# Altium footprint library con-samtec.PCBLIB: 805 footprints (part 43 of 55) (continued)
## TSW-134-02-S-T [mm] (continued)
  rectangle: -21.94,-2.89 -21.24,-2.19
  rectangle: -21.94,-0.35 -21.24,0.35
  rectangle: -21.94,2.19 -21.24,2.89
  rectangle: -19.4,-2.89 -18.7,-2.19
  rectangle: -19.4,-0.35 -18.7,0.35
  rectangle: -19.4,2.19 -18.7,2.89
  rectangle: -16.86,-2.89 -16.16,-2.19
  rectangle: -16.86,-0.35 -16.16,0.35
  rectangle: -16.86,2.19 -16.16,2.89
  rectangle: -14.32,-2.89 -13.62,-2.19
  rectangle: -14.32,-0.35 -13.62,0.35
  rectangle: -14.32,2.19 -13.62,2.89
  rectangle: -11.78,-2.89 -11.08,-2.19
  rectangle: -11.78,-0.35 -11.08,0.35
  rectangle: -11.78,2.19 -11.08,2.89
  rectangle: -9.24,-2.89 -8.54,-2.19
  rectangle: -9.24,-0.35 -8.54,0.35
  rectangle: -9.24,2.19 -8.54,2.89
  rectangle: -6.7,-2.89 -6,-2.19
  rectangle: -6.7,-0.35 -6,0.35
  rectangle: -6.7,2.19 -6,2.89
  rectangle: -4.16,-2.89 -3.46,-2.19
  rectangle: -4.16,-0.35 -3.46,0.35
  rectangle: -4.16,2.19 -3.46,2.89
  rectangle: -1.62,-2.89 -0.92,-2.19
  rectangle: -1.62,-0.35 -0.92,0.35
  rectangle: -1.62,2.19 -0.92,2.89
  rectangle: 0.92,-2.89 1.62,-2.19
  rectangle: 0.92,-0.35 1.62,0.35
  rectangle: 0.92,2.19 1.62,2.89
  rectangle: 3.46,-2.89 4.16,-2.19
  rectangle: 3.46,-0.35 4.16,0.35
  rectangle: 3.46,2.19 4.16,2.89
  rectangle: 6,-2.89 6.7,-2.19
  rectangle: 6,-0.35 6.7,0.35
  rectangle: 6,2.19 6.7,2.89
  rectangle: 8.54,-2.89 9.24,-2.19
  rectangle: 8.54,-0.35 9.24,0.35
  rectangle: 8.54,2.19 9.24,2.89
  rectangle: 11.08,-2.89 11.78,-2.19
  rectangle: 11.08,-0.35 11.78,0.35
  rectangle: 11.08,2.19 11.78,2.89
  rectangle: 13.62,-2.89 14.32,-2.19
  rectangle: 13.62,-0.35 14.32,0.35
  rectangle: 13.62,2.19 14.32,2.89
  rectangle: 16.16,-2.89 16.86,-2.19
  rectangle: 16.16,-0.35 16.86,0.35
  rectangle: 16.16,2.19 16.86,2.89
  rectangle: 18.7,-2.89 19.4,-2.19
  rectangle: 18.7,-0.35 19.4,0.35
  rectangle: 18.7,2.19 19.4,2.89
  rectangle: 21.24,-2.89 21.94,-2.19
  rectangle: 21.24,-0.35 21.94,0.35
  rectangle: 21.24,2.19 21.94,2.89
  rectangle: 23.78,-2.89 24.48,-2.19
  rectangle: 23.78,-0.35 24.48,0.35
  rectangle: 23.78,2.19 24.48,2.89
  rectangle: 26.32,-2.89 27.02,-2.19
  rectangle: 26.32,-0.35 27.02,0.35
  rectangle: 26.32,2.19 27.02,2.89
  rectangle: 28.86,-2.89 29.56,-2.19
  rectangle: 28.86,-0.35 29.56,0.35
  rectangle: 28.86,2.19 29.56,2.89
  rectangle: 31.4,-2.89 32.1,-2.19
  rectangle: 31.4,-0.35 32.1,0.35
  rectangle: 31.4,2.19 32.1,2.89
  rectangle: 33.94,-2.89 34.64,-2.19
  rectangle: 33.94,-0.35 34.64,0.35
  rectangle: 33.94,2.19 34.64,2.89
  rectangle: 36.48,-2.89 37.18,-2.19
  rectangle: 36.48,-0.35 37.18,0.35
  rectangle: 36.48,2.19 37.18,2.89
  rectangle: 39.02,-2.89 39.72,-2.19
  rectangle: 39.02,-0.35 39.72,0.35
  rectangle: 39.02,2.19 39.72,2.89
  rectangle: 41.56,-2.89 42.26,-2.19
  rectangle: 41.56,-0.35 42.26,0.35
  rectangle: 41.56,2.19 42.26,2.89

## TSW-134-02-S-T-RA [mil]
pads (102):
  oct 59.06x59.06 hole 39.37: 1(1650,60) 2(1650,160) 3(1650,260) 4(1550,60) 5(1550,160) 6(1550,260) 7(1450,60) 8(1450,160) 9(1450,260) 10(1350,60) 11(1350,160) 12(1350,260) 13(1250,60) 14(1250,160) 15(1250,260) 16(1150,60) 17(1150,160) 18(1150,260) 19(1050,60) 20(1050,160) 21(1050,260) 22(950,60) 23(950,160) 24(950,260) 25(850,60) 26(850,160) 27(850,260) 28(750,60) 29(750,160) 30(750,260) 31(650,60) 32(650,160) 33(650,260) 34(550,60) 35(550,160) 36(550,260) 37(450,60) 38(450,160) 39(450,260) 40(350,60) 41(350,160) 42(350,260) 43(250,60) 44(250,160) 45(250,260) 46(150,60) 47(150,160) 48(150,260) 49(50,60) 50(50,160) 51(50,260) 52(-50,60) 53(-50,160) 54(-50,260) 55(-150,60) 56(-150,160) 57(-150,260) 58(-250,60) 59(-250,160) 60(-250,260) 61(-350,60) 62(-350,160) 63(-350,260) 64(-450,60) 65(-450,160) 66(-450,260) 67(-550,60) 68(-550,160) 69(-550,260) 70(-650,60) 71(-650,160) 72(-650,260) 73(-750,60) 74(-750,160) 75(-750,260) 76(-850,60) 77(-850,160) 78(-850,260) 79(-950,60) 80(-950,160) 81(-950,260) 82(-1050,60) 83(-1050,160) 84(-1050,260) 85(-1150,60) 86(-1150,160) 87(-1150,260) 88(-1250,60) 89(-1250,160) 90(-1250,260) 91(-1350,60) 92(-1350,160) 93(-1350,260) 94(-1450,60) 95(-1450,160) 96(-1450,260) 97(-1550,60) 98(-1550,160) 99(-1550,260) 100(-1650,60) 101(-1650,160) 102(-1650,260)
Top Overlay:
  rectangle: -1660,-310.63 -1640,-80.32
  rectangle: -1560,-310.63 -1540,-80.32
  rectangle: -1460,-310.63 -1440,-80.32
  rectangle: -1360,-310.63 -1340,-80.32
  rectangle: -1260,-310.63 -1240,-80.32
  rectangle: -1160,-310.63 -1140,-80.32
  rectangle: -1060,-310.63 -1040,-80.32
  rectangle: -960,-310.63 -940,-80.32
  rectangle: -860,-310.63 -840,-80.32
  rectangle: -760,-310.63 -740,-80.32
  rectangle: -660,-310.63 -640,-80.32
  rectangle: -560,-310.63 -540,-80.32
  rectangle: -460,-310.63 -440,-80.32
  rectangle: -360,-310.63 -340,-80.32
  rectangle: -260,-310.63 -240,-80.32
  rectangle: -160,-310.63 -140,-80.32
  rectangle: -60,-310.63 -40,-80.32
  rectangle: 40,-310.63 60,-80.32
  rectangle: 140,-310.63 160,-80.32
  rectangle: 240,-310.63 260,-80.32
  rectangle: 340,-310.63 360,-80.32
  rectangle: 440,-310.63 460,-80.32
  rectangle: 540,-310.63 560,-80.32
  rectangle: 640,-310.63 660,-80.32
  rectangle: 740,-310.63 760,-80.32
  rectangle: 840,-310.63 860,-80.32
  rectangle: 940,-310.63 960,-80.32
  rectangle: 1040,-310.63 1060,-80.32
  rectangle: 1140,-310.63 1160,-80.32
  rectangle: 1240,-310.63 1260,-80.32
  rectangle: 1340,-310.63 1360,-80.32
  rectangle: 1440,-310.63 1460,-80.32
  rectangle: 1540,-310.63 1560,-80.32
  rectangle: 1640,-310.63 1660,-80.32
  lines w8: -1705.08,-80.55 1705.08,-80.55 1705.08,-4.17 -1705.08,-4.17 -1705.08,-80.55
  text "1" at 1701.57,41.34 h36.81
  text "3" at 1702.17,236.81 h36.81
Mechanical 16:
  rectangle: -1660,0 -1640,270
  rectangle: -1560,0 -1540,270
  rectangle: -1460,0 -1440,270
  rectangle: -1360,0 -1340,270
  rectangle: -1260,0 -1240,270
  rectangle: -1160,0 -1140,270
  rectangle: -1060,0 -1040,270
  rectangle: -960,0 -940,270
  rectangle: -860,0 -840,270
  rectangle: -760,0 -740,270
  rectangle: -660,0 -640,270
  rectangle: -560,0 -540,270
  rectangle: -460,0 -440,270
  rectangle: -360,0 -340,270
  rectangle: -260,0 -240,270
  rectangle: -160,0 -140,270
  rectangle: -60,0 -40,270
  rectangle: 40,0 60,270
  rectangle: 140,0 160,270
  rectangle: 240,0 260,270
  rectangle: 340,0 360,270
  rectangle: 440,0 460,270
  rectangle: 540,0 560,270
  rectangle: 640,0 660,270
  rectangle: 740,0 760,270
  rectangle: 840,0 860,270
  rectangle: 940,0 960,270
  rectangle: 1040,0 1060,270
  rectangle: 1140,0 1160,270
  rectangle: 1240,0 1260,270
  rectangle: 1340,0 1360,270
  rectangle: 1440,0 1460,270
  rectangle: 1540,0 1560,270
  rectangle: 1640,0 1660,270

## TSW-135-02-S-D [mm]
pads (70):
  oct 1.5x1.5 hole 1: 1(43.18,-1.27) 2(43.18,1.27) 3(40.64,-1.27) 4(40.64,1.27) 5(38.1,-1.27) 6(38.1,1.27) 7(35.56,-1.27) 8(35.56,1.27) 9(33.02,-1.27) 10(33.02,1.27) 11(30.48,-1.27) 12(30.48,1.27) 13(27.94,-1.27) 14(27.94,1.27) 15(25.4,-1.27) 16(25.4,1.27) 17(22.86,-1.27) 18(22.86,1.27) 19(20.32,-1.27) 20(20.32,1.27) 21(17.78,-1.27) 22(17.78,1.27) 23(15.24,-1.27) 24(15.24,1.27) 25(12.7,-1.27) 26(12.7,1.27) 27(10.16,-1.27) 28(10.16,1.27) 29(7.62,-1.27) 30(7.62,1.27) 31(5.08,-1.27) 32(5.08,1.27) 33(2.54,-1.27) 34(2.54,1.27) 35(0,-1.27) 36(0,1.27) 37(-2.54,-1.27) 38(-2.54,1.27) 39(-5.08,-1.27) 40(-5.08,1.27) 41(-7.62,-1.27) 42(-7.62,1.27) 43(-10.16,-1.27) 44(-10.16,1.27) 45(-12.7,-1.27) 46(-12.7,1.27) 47(-15.24,-1.27) 48(-15.24,1.27) 49(-17.78,-1.27) 50(-17.78,1.27) 51(-20.32,-1.27) 52(-20.32,1.27) 53(-22.86,-1.27) 54(-22.86,1.27) 55(-25.4,-1.27) 56(-25.4,1.27) 57(-27.94,-1.27) 58(-27.94,1.27) 59(-30.48,-1.27) 60(-30.48,1.27) 61(-33.02,-1.27) 62(-33.02,1.27) 63(-35.56,-1.27) 64(-35.56,1.27) 65(-38.1,-1.27) 66(-38.1,1.27) 67(-40.64,-1.27) 68(-40.64,1.27) 69(-43.18,-1.27) 70(-43.18,1.27)
Top Overlay:
  lines w0.203: -44.579,-2.425 44.579,-2.425 44.579,2.425 -44.579,2.425 -44.579,-2.425
  text "1" at 42.972,-3.818 h0.94
  text "2" at 42.797,2.744 h0.94
Mechanical 16:
  rectangle: -43.53,-1.62 -42.83,-0.92
  rectangle: -43.53,0.92 -42.83,1.62
  rectangle: -40.99,-1.62 -40.29,-0.92
  rectangle: -40.99,0.92 -40.29,1.62
  rectangle: -38.45,-1.62 -37.75,-0.92
  rectangle: -38.45,0.92 -37.75,1.62
  rectangle: -35.91,-1.62 -35.21,-0.92
  rectangle: -35.91,0.92 -35.21,1.62
  rectangle: -33.37,-1.62 -32.67,-0.92
  rectangle: -33.37,0.92 -32.67,1.62
  rectangle: -30.83,-1.62 -30.13,-0.92
  rectangle: -30.83,0.92 -30.13,1.62
  rectangle: -28.29,-1.62 -27.59,-0.92
  rectangle: -28.29,0.92 -27.59,1.62
  rectangle: -25.75,-1.62 -25.05,-0.92
  rectangle: -25.75,0.92 -25.05,1.62
  rectangle: -23.21,-1.62 -22.51,-0.92
  rectangle: -23.21,0.92 -22.51,1.62
  rectangle: -20.67,-1.62 -19.97,-0.92
  rectangle: -20.67,0.92 -19.97,1.62
  rectangle: -18.13,-1.62 -17.43,-0.92
  rectangle: -18.13,0.92 -17.43,1.62
  rectangle: -15.59,-1.62 -14.89,-0.92
  rectangle: -15.59,0.92 -14.89,1.62
  rectangle: -13.05,-1.62 -12.35,-0.92
  rectangle: -13.05,0.92 -12.35,1.62
  rectangle: -10.51,-1.62 -9.81,-0.92
  rectangle: -10.51,0.92 -9.81,1.62
  rectangle: -7.97,-1.62 -7.27,-0.92
  rectangle: -7.97,0.92 -7.27,1.62
  rectangle: -5.43,-1.62 -4.73,-0.92
  rectangle: -5.43,0.92 -4.73,1.62
  rectangle: -2.89,-1.62 -2.19,-0.92
  rectangle: -2.89,0.92 -2.19,1.62
  rectangle: -0.35,-1.62 0.35,-0.92
  rectangle: -0.35,0.92 0.35,1.62
  rectangle: 2.19,-1.62 2.89,-0.92
  rectangle: 2.19,0.92 2.89,1.62
  rectangle: 4.73,-1.62 5.43,-0.92
  rectangle: 4.73,0.92 5.43,1.62
  rectangle: 7.27,-1.62 7.97,-0.92
  rectangle: 7.27,0.92 7.97,1.62
  rectangle: 9.81,-1.62 10.51,-0.92
  rectangle: 9.81,0.92 10.51,1.62
  rectangle: 12.35,-1.62 13.05,-0.92
  rectangle: 12.35,0.92 13.05,1.62
  rectangle: 14.89,-1.62 15.59,-0.92
  rectangle: 14.89,0.92 15.59,1.62
  rectangle: 17.43,-1.62 18.13,-0.92
  rectangle: 17.43,0.92 18.13,1.62
  rectangle: 19.97,-1.62 20.67,-0.92
  rectangle: 19.97,0.92 20.67,1.62
  rectangle: 22.51,-1.62 23.21,-0.92
  rectangle: 22.51,0.92 23.21,1.62
  rectangle: 25.05,-1.62 25.75,-0.92
  rectangle: 25.05,0.92 25.75,1.62
  rectangle: 27.59,-1.62 28.29,-0.92
  rectangle: 27.59,0.92 28.29,1.62
  rectangle: 30.13,-1.62 30.83,-0.92
  rectangle: 30.13,0.92 30.83,1.62
  rectangle: 32.67,-1.62 33.37,-0.92
  rectangle: 32.67,0.92 33.37,1.62
  rectangle: 35.21,-1.62 35.91,-0.92
  rectangle: 35.21,0.92 35.91,1.62
  rectangle: 37.75,-1.62 38.45,-0.92
  rectangle: 37.75,0.92 38.45,1.62
  rectangle: 40.29,-1.62 40.99,-0.92
  rectangle: 40.29,0.92 40.99,1.62
  rectangle: 42.83,-1.62 43.53,-0.92
  rectangle: 42.83,0.92 43.53,1.62

## TSW-135-02-S-D-RA [mil]
pads (70):
  oct 59.06x59.06 hole 39.37: 1(1700,60) 2(1700,160) 3(1600,60) 4(1600,160) 5(1500,60) 6(1500,160) 7(1400,60) 8(1400,160) 9(1300,60) 10(1300,160) 11(1200,60) 12(1200,160) 13(1100,60) 14(1100,160) 15(1000,60) 16(1000,160) 17(900,60) 18(900,160) 19(800,60) 20(800,160) 21(700,60) 22(700,160) 23(600,60) 24(600,160) 25(500,60) 26(500,160) 27(400,60) 28(400,160) 29(300,60) 30(300,160) 31(200,60) 32(200,160) 33(100,60) 34(100,160) 35(0,60) 36(0,160) 37(-100,60) 38(-100,160) 39(-200,60) 40(-200,160) 41(-300,60) 42(-300,160) 43(-400,60) 44(-400,160) 45(-500,60) 46(-500,160) 47(-600,60) 48(-600,160) 49(-700,60) 50(-700,160) 51(-800,60) 52(-800,160) 53(-900,60) 54(-900,160) 55(-1000,60) 56(-1000,160) 57(-1100,60) 58(-1100,160) 59(-1200,60) 60(-1200,160) 61(-1300,60) 62(-1300,160) 63(-1400,60) 64(-1400,160) 65(-1500,60) 66(-1500,160) 67(-1600,60) 68(-1600,160) 69(-1700,60) 70(-1700,160)
Top Overlay:
  rectangle: -1710,-310.63 -1690,-80.32
  rectangle: -1610,-310.63 -1590,-80.32
  rectangle: -1510,-310.63 -1490,-80.32
  rectangle: -1410,-310.63 -1390,-80.32
  rectangle: -1310,-310.63 -1290,-80.32
  rectangle: -1210,-310.63 -1190,-80.32
  rectangle: -1110,-310.63 -1090,-80.32
  rectangle: -1010,-310.63 -990,-80.32
  rectangle: -910,-310.63 -890,-80.32
  rectangle: -810,-310.63 -790,-80.32
  rectangle: -710,-310.63 -690,-80.32
  rectangle: -610,-310.63 -590,-80.32
  rectangle: -510,-310.63 -490,-80.32
  rectangle: -410,-310.63 -390,-80.32
  rectangle: -310,-310.63 -290,-80.32
  rectangle: -210,-310.63 -190,-80.32
  rectangle: -110,-310.63 -90,-80.32
  rectangle: -10,-310.63 10,-80.32
  rectangle: 90,-310.63 110,-80.32
  rectangle: 190,-310.63 210,-80.32
  rectangle: 290,-310.63 310,-80.32
  rectangle: 390,-310.63 410,-80.32
  rectangle: 490,-310.63 510,-80.32
  rectangle: 590,-310.63 610,-80.32
  rectangle: 690,-310.63 710,-80.32
  rectangle: 790,-310.63 810,-80.32
  rectangle: 890,-310.63 910,-80.32
  rectangle: 990,-310.63 1010,-80.32
  rectangle: 1090,-310.63 1110,-80.32
  rectangle: 1190,-310.63 1210,-80.32
  rectangle: 1290,-310.63 1310,-80.32
  rectangle: 1390,-310.63 1410,-80.32
  rectangle: 1490,-310.63 1510,-80.32
  rectangle: 1590,-310.63 1610,-80.32
  rectangle: 1690,-310.63 1710,-80.32
  lines w8: -1755.08,-80.55 1755.08,-80.55 1755.08,-4.17 -1755.08,-4.17 -1755.08,-80.55
  text "1" at 1750.59,30.51 h36.81
  text "2" at 1749.21,129.53 h36.81
Mechanical 16:
  rectangle: -1710,0 -1690,170
  rectangle: -1610,0 -1590,170
  rectangle: -1510,0 -1490,170
  rectangle: -1410,0 -1390,170
  rectangle: -1310,0 -1290,170
  rectangle: -1210,0 -1190,170
  rectangle: -1110,0 -1090,170
  rectangle: -1010,0 -990,170
  rectangle: -910,0 -890,170
  rectangle: -810,0 -790,170
  rectangle: -710,0 -690,170
  rectangle: -610,0 -590,170
  rectangle: -510,0 -490,170
  rectangle: -410,0 -390,170
  rectangle: -310,0 -290,170
  rectangle: -210,0 -190,170
  rectangle: -110,0 -90,170
  rectangle: -10,0 10,170
  rectangle: 90,0 110,170
  rectangle: 190,0 210,170
  rectangle: 290,0 310,170
  rectangle: 390,0 410,170
  rectangle: 490,0 510,170
  rectangle: 590,0 610,170
  rectangle: 690,0 710,170
  rectangle: 790,0 810,170
  rectangle: 890,0 910,170
  rectangle: 990,0 1010,170
  rectangle: 1090,0 1110,170
  rectangle: 1190,0 1210,170
  rectangle: 1290,0 1310,170
  rectangle: 1390,0 1410,170
  rectangle: 1490,0 1510,170
  rectangle: 1590,0 1610,170
  rectangle: 1690,0 1710,170

## TSW-135-02-S-Q [mm]
pads (70):
  oct 1.5x1.5 hole 1: 1(43.18,-2.54) 2(43.18,2.54) 3(40.64,-2.54) 4(40.64,2.54) 5(38.1,-2.54) 6(38.1,2.54) 7(35.56,-2.54) 8(35.56,2.54) 9(33.02,-2.54) 10(33.02,2.54) 11(30.48,-2.54) 12(30.48,2.54) 13(27.94,-2.54) 14(27.94,2.54) 15(25.4,-2.54) 16(25.4,2.54) 17(22.86,-2.54) 18(22.86,2.54) 19(20.32,-2.54) 20(20.32,2.54) 21(17.78,-2.54) 22(17.78,2.54) 23(15.24,-2.54) 24(15.24,2.54) 25(12.7,-2.54) 26(12.7,2.54) 27(10.16,-2.54) 28(10.16,2.54) 29(7.62,-2.54) 30(7.62,2.54) 31(5.08,-2.54) 32(5.08,2.54) 33(2.54,-2.54) 34(2.54,2.54) 35(0,-2.54) 36(0,2.54) 37(-2.54,-2.54) 38(-2.54,2.54) 39(-5.08,-2.54) 40(-5.08,2.54) 41(-7.62,-2.54) 42(-7.62,2.54) 43(-10.16,-2.54) 44(-10.16,2.54) 45(-12.7,-2.54) 46(-12.7,2.54) 47(-15.24,-2.54) 48(-15.24,2.54) 49(-17.78,-2.54) 50(-17.78,2.54) 51(-20.32,-2.54) 52(-20.32,2.54) 53(-22.86,-2.54) 54(-22.86,2.54) 55(-25.4,-2.54) 56(-25.4,2.54) 57(-27.94,-2.54) 58(-27.94,2.54) 59(-30.48,-2.54) 60(-30.48,2.54) 61(-33.02,-2.54) 62(-33.02,2.54) 63(-35.56,-2.54) 64(-35.56,2.54) 65(-38.1,-2.54) 66(-38.1,2.54) 67(-40.64,-2.54) 68(-40.64,2.54) 69(-43.18,-2.54) 70(-43.18,2.54)
Top Overlay:
  lines w0.203: -44.579,-3.695 44.579,-3.695 44.579,3.695 -44.579,3.695 -44.579,-3.695
  text "1" at 43.022,-5.138 h0.94
  text "2" at 42.922,3.989 h0.94
Mechanical 16:
  rectangle: -43.53,-2.89 -42.83,-2.19
  rectangle: -43.53,2.19 -42.83,2.89
  rectangle: -40.99,-2.89 -40.29,-2.19
  rectangle: -40.99,2.19 -40.29,2.89
  rectangle: -38.45,-2.89 -37.75,-2.19
  rectangle: -38.45,2.19 -37.75,2.89
  rectangle: -35.91,-2.89 -35.21,-2.19
  rectangle: -35.91,2.19 -35.21,2.89
  rectangle: -33.37,-2.89 -32.67,-2.19
  rectangle: -33.37,2.19 -32.67,2.89
  rectangle: -30.83,-2.89 -30.13,-2.19
  rectangle: -30.83,2.19 -30.13,2.89
  rectangle: -28.29,-2.89 -27.59,-2.19
  rectangle: -28.29,2.19 -27.59,2.89
  rectangle: -25.75,-2.89 -25.05,-2.19
  rectangle: -25.75,2.19 -25.05,2.89
  rectangle: -23.21,-2.89 -22.51,-2.19
  rectangle: -23.21,2.19 -22.51,2.89
  rectangle: -20.67,-2.89 -19.97,-2.19
  rectangle: -20.67,2.19 -19.97,2.89
  rectangle: -18.13,-2.89 -17.43,-2.19
  rectangle: -18.13,2.19 -17.43,2.89
  rectangle: -15.59,-2.89 -14.89,-2.19
  rectangle: -15.59,2.19 -14.89,2.89
  rectangle: -13.05,-2.89 -12.35,-2.19
  rectangle: -13.05,2.19 -12.35,2.89
  rectangle: -10.51,-2.89 -9.81,-2.19
  rectangle: -10.51,2.19 -9.81,2.89
  rectangle: -7.97,-2.89 -7.27,-2.19
  rectangle: -7.97,2.19 -7.27,2.89
  rectangle: -5.43,-2.89 -4.73,-2.19
  rectangle: -5.43,2.19 -4.73,2.89
  rectangle: -2.89,-2.89 -2.19,-2.19
  rectangle: -2.89,2.19 -2.19,2.89
  rectangle: -0.35,-2.89 0.35,-2.19
  rectangle: -0.35,2.19 0.35,2.89
  rectangle: 2.19,-2.89 2.89,-2.19
  rectangle: 2.19,2.19 2.89,2.89
  rectangle: 4.73,-2.89 5.43,-2.19
  rectangle: 4.73,2.19 5.43,2.89
  rectangle: 7.27,-2.89 7.97,-2.19
  rectangle: 7.27,2.19 7.97,2.89
  rectangle: 9.81,-2.89 10.51,-2.19
  rectangle: 9.81,2.19 10.51,2.89
  rectangle: 12.35,-2.89 13.05,-2.19
  rectangle: 12.35,2.19 13.05,2.89
  rectangle: 14.89,-2.89 15.59,-2.19
  rectangle: 14.89,2.19 15.59,2.89
  rectangle: 17.43,-2.89 18.13,-2.19
  rectangle: 17.43,2.19 18.13,2.89
  rectangle: 19.97,-2.89 20.67,-2.19
  rectangle: 19.97,2.19 20.67,2.89
  rectangle: 22.51,-2.89 23.21,-2.19
  rectangle: 22.51,2.19 23.21,2.89
  rectangle: 25.05,-2.89 25.75,-2.19
  rectangle: 25.05,2.19 25.75,2.89
  rectangle: 27.59,-2.89 28.29,-2.19
  rectangle: 27.59,2.19 28.29,2.89
  rectangle: 30.13,-2.89 30.83,-2.19
  rectangle: 30.13,2.19 30.83,2.89
  rectangle: 32.67,-2.89 33.37,-2.19
  rectangle: 32.67,2.19 33.37,2.89
  rectangle: 35.21,-2.89 35.91,-2.19
  rectangle: 35.21,2.19 35.91,2.89
  rectangle: 37.75,-2.89 38.45,-2.19
  rectangle: 37.75,2.19 38.45,2.89
  rectangle: 40.29,-2.89 40.99,-2.19
  rectangle: 40.29,2.19 40.99,2.89
  rectangle: 42.83,-2.89 43.53,-2.19
  rectangle: 42.83,2.19 43.53,2.89

## TSW-135-02-S-Q-RA [mil]
pads (70):
  oct 59.06x59.06 hole 39.37: 1(1700,60) 2(1700,260) 3(1600,60) 4(1600,260) 5(1500,60) 6(1500,260) 7(1400,60) 8(1400,260) 9(1300,60) 10(1300,260) 11(1200,60) 12(1200,260) 13(1100,60) 14(1100,260) 15(1000,60) 16(1000,260) 17(900,60) 18(900,260) 19(800,60) 20(800,260) 21(700,60) 22(700,260) 23(600,60) 24(600,260) 25(500,60) 26(500,260) 27(400,60) 28(400,260) 29(300,60) 30(300,260) 31(200,60) 32(200,260) 33(100,60) 34(100,260) 35(0,60) 36(0,260) 37(-100,60) 38(-100,260) 39(-200,60) 40(-200,260) 41(-300,60) 42(-300,260) 43(-400,60) 44(-400,260) 45(-500,60) 46(-500,260) 47(-600,60) 48(-600,260) 49(-700,60) 50(-700,260) 51(-800,60) 52(-800,260) 53(-900,60) 54(-900,260) 55(-1000,60) 56(-1000,260) 57(-1100,60) 58(-1100,260) 59(-1200,60) 60(-1200,260) 61(-1300,60) 62(-1300,260) 63(-1400,60) 64(-1400,260) 65(-1500,60) 66(-1500,260) 67(-1600,60) 68(-1600,260) 69(-1700,60) 70(-1700,260)
Top Overlay:
  rectangle: -1710,-310.63 -1690,-80.32
  rectangle: -1610,-310.63 -1590,-80.32
  rectangle: -1510,-310.63 -1490,-80.32
  rectangle: -1410,-310.63 -1390,-80.32
  rectangle: -1310,-310.63 -1290,-80.32
  rectangle: -1210,-310.63 -1190,-80.32
  rectangle: -1110,-310.63 -1090,-80.32
  rectangle: -1010,-310.63 -990,-80.32
  rectangle: -910,-310.63 -890,-80.32
  rectangle: -810,-310.63 -790,-80.32
  rectangle: -710,-310.63 -690,-80.32
  rectangle: -610,-310.63 -590,-80.32
  rectangle: -510,-310.63 -490,-80.32
  rectangle: -410,-310.63 -390,-80.32
  rectangle: -310,-310.63 -290,-80.32
  rectangle: -210,-310.63 -190,-80.32
  rectangle: -110,-310.63 -90,-80.32
  rectangle: -10,-310.63 10,-80.32
  rectangle: 90,-310.63 110,-80.32
  rectangle: 190,-310.63 210,-80.32
  rectangle: 290,-310.63 310,-80.32
  rectangle: 390,-310.63 410,-80.32
  rectangle: 490,-310.63 510,-80.32
  rectangle: 590,-310.63 610,-80.32
  rectangle: 690,-310.63 710,-80.32
  rectangle: 790,-310.63 810,-80.32
  rectangle: 890,-310.63 910,-80.32
  rectangle: 990,-310.63 1010,-80.32
  rectangle: 1090,-310.63 1110,-80.32
  rectangle: 1190,-310.63 1210,-80.32
  rectangle: 1290,-310.63 1310,-80.32
  rectangle: 1390,-310.63 1410,-80.32
  rectangle: 1490,-310.63 1510,-80.32
  rectangle: 1590,-310.63 1610,-80.32
  rectangle: 1690,-310.63 1710,-80.32
  lines w8: -1755.08,-80.55 1755.08,-80.55 1755.08,-4.17 -1755.08,-4.17 -1755.08,-80.55
  text "1" at 1753.54,43.31 h36.81
  text "2" at 1751.18,242.72 h36.81
Mechanical 16:
  rectangle: -1710,0 -1690,270
  rectangle: -1610,0 -1590,270
  rectangle: -1510,0 -1490,270
  rectangle: -1410,0 -1390,270
  rectangle: -1310,0 -1290,270
  rectangle: -1210,0 -1190,270
  rectangle: -1110,0 -1090,270
  rectangle: -1010,0 -990,270
  rectangle: -910,0 -890,270
  rectangle: -810,0 -790,270
  rectangle: -710,0 -690,270
  rectangle: -610,0 -590,270
  rectangle: -510,0 -490,270
  rectangle: -410,0 -390,270
  rectangle: -310,0 -290,270
  rectangle: -210,0 -190,270
  rectangle: -110,0 -90,270
  rectangle: -10,0 10,270
  rectangle: 90,0 110,270
  rectangle: 190,0 210,270
  rectangle: 290,0 310,270
  rectangle: 390,0 410,270
  rectangle: 490,0 510,270
  rectangle: 590,0 610,270
  rectangle: 690,0 710,270
  rectangle: 790,0 810,270
  rectangle: 890,0 910,270
  rectangle: 990,0 1010,270
  rectangle: 1090,0 1110,270
  rectangle: 1190,0 1210,270
  rectangle: 1290,0 1310,270
  rectangle: 1390,0 1410,270
  rectangle: 1490,0 1510,270
  rectangle: 1590,0 1610,270
  rectangle: 1690,0 1710,270

## TSW-135-02-S-S [mm]
pads (35):
  oct 1.5x1.5 hole 1: 1(43.18,0) 2(40.64,0) 3(38.1,0) 4(35.56,0) 5(33.02,0) 6(30.48,0) 7(27.94,0) 8(25.4,0) 9(22.86,0) 10(20.32,0) 11(17.78,0) 12(15.24,0) 13(12.7,0) 14(10.16,0) 15(7.62,0) 16(5.08,0) 17(2.54,0) 18(0,0) 19(-2.54,0) 20(-5.08,0) 21(-7.62,0) 22(-10.16,0) 23(-12.7,0) 24(-15.24,0) 25(-17.78,0) 26(-20.32,0) 27(-22.86,0) 28(-25.4,0) 29(-27.94,0) 30(-30.48,0) 31(-33.02,0) 32(-35.56,0) 33(-38.1,0) 34(-40.64,0) 35(-43.18,0)
Top Overlay:
  lines w0.203: -44.579,-1.155 44.579,-1.155 44.579,1.155 -44.579,1.155 -44.579,-1.155
  text "1" at 42.922,-2.498 h0.94
Mechanical 16:
  rectangle: -43.53,-0.35 -42.83,0.35
  rectangle: -40.99,-0.35 -40.29,0.35
  rectangle: -38.45,-0.35 -37.75,0.35
  rectangle: -35.91,-0.35 -35.21,0.35
  rectangle: -33.37,-0.35 -32.67,0.35
  rectangle: -30.83,-0.35 -30.13,0.35
  rectangle: -28.29,-0.35 -27.59,0.35
  rectangle: -25.75,-0.35 -25.05,0.35
  rectangle: -23.21,-0.35 -22.51,0.35
  rectangle: -20.67,-0.35 -19.97,0.35
  rectangle: -18.13,-0.35 -17.43,0.35
  rectangle: -15.59,-0.35 -14.89,0.35
  rectangle: -13.05,-0.35 -12.35,0.35
  rectangle: -10.51,-0.35 -9.81,0.35
  rectangle: -7.97,-0.35 -7.27,0.35
  rectangle: -5.43,-0.35 -4.73,0.35
  rectangle: -2.89,-0.35 -2.19,0.35
  rectangle: -0.35,-0.35 0.35,0.35
  rectangle: 2.19,-0.35 2.89,0.35
  rectangle: 4.73,-0.35 5.43,0.35
  rectangle: 7.27,-0.35 7.97,0.35
  rectangle: 9.81,-0.35 10.51,0.35
  rectangle: 12.35,-0.35 13.05,0.35
  rectangle: 14.89,-0.35 15.59,0.35
  rectangle: 17.43,-0.35 18.13,0.35
  rectangle: 19.97,-0.35 20.67,0.35
  rectangle: 22.51,-0.35 23.21,0.35
  rectangle: 25.05,-0.35 25.75,0.35
  rectangle: 27.59,-0.35 28.29,0.35
  rectangle: 30.13,-0.35 30.83,0.35
  rectangle: 32.67,-0.35 33.37,0.35
  rectangle: 35.21,-0.35 35.91,0.35
  rectangle: 37.75,-0.35 38.45,0.35
  rectangle: 40.29,-0.35 40.99,0.35
  rectangle: 42.83,-0.35 43.53,0.35

## TSW-135-02-S-S-RA [mil]
pads (35):
  oct 59.06x59.06 hole 39.37: 1(1700,60) 2(1600,60) 3(1500,60) 4(1400,60) 5(1300,60) 6(1200,60) 7(1100,60) 8(1000,60) 9(900,60) 10(800,60) 11(700,60) 12(600,60) 13(500,60) 14(400,60) 15(300,60) 16(200,60) 17(100,60) 18(0,60) 19(-100,60) 20(-200,60) 21(-300,60) 22(-400,60) 23(-500,60) 24(-600,60) 25(-700,60) 26(-800,60) 27(-900,60) 28(-1000,60) 29(-1100,60) 30(-1200,60) 31(-1300,60) 32(-1400,60) 33(-1500,60) 34(-1600,60) 35(-1700,60)
Top Overlay:
  rectangle: -1710,-310.63 -1690,-80.32
  rectangle: -1610,-310.63 -1590,-80.32
  rectangle: -1510,-310.63 -1490,-80.32
  rectangle: -1410,-310.63 -1390,-80.32
  rectangle: -1310,-310.63 -1290,-80.32
  rectangle: -1210,-310.63 -1190,-80.32
  rectangle: -1110,-310.63 -1090,-80.32
  rectangle: -1010,-310.63 -990,-80.32
  rectangle: -910,-310.63 -890,-80.32
  rectangle: -810,-310.63 -790,-80.32
  rectangle: -710,-310.63 -690,-80.32
  rectangle: -610,-310.63 -590,-80.32
  rectangle: -510,-310.63 -490,-80.32
  rectangle: -410,-310.63 -390,-80.32
  rectangle: -310,-310.63 -290,-80.32
  rectangle: -210,-310.63 -190,-80.32
  rectangle: -110,-310.63 -90,-80.32
  rectangle: -10,-310.63 10,-80.32
  rectangle: 90,-310.63 110,-80.32
  rectangle: 190,-310.63 210,-80.32
  rectangle: 290,-310.63 310,-80.32
  rectangle: 390,-310.63 410,-80.32
  rectangle: 490,-310.63 510,-80.32
  rectangle: 590,-310.63 610,-80.32
  rectangle: 690,-310.63 710,-80.32
  rectangle: 790,-310.63 810,-80.32
  rectangle: 890,-310.63 910,-80.32
  rectangle: 990,-310.63 1010,-80.32
  rectangle: 1090,-310.63 1110,-80.32
  rectangle: 1190,-310.63 1210,-80.32
  rectangle: 1290,-310.63 1310,-80.32
  rectangle: 1390,-310.63 1410,-80.32
  rectangle: 1490,-310.63 1510,-80.32
  rectangle: 1590,-310.63 1610,-80.32
  rectangle: 1690,-310.63 1710,-80.32
  lines w8: -1755.08,-80.55 1755.08,-80.55 1755.08,-4.17 -1755.08,-4.17 -1755.08,-80.55
  text "1" at 1750.47,45.35 h36.81
Mechanical 16:
  rectangle: -1710,0 -1690,70
  rectangle: -1610,0 -1590,70
  rectangle: -1510,0 -1490,70
  rectangle: -1410,0 -1390,70
  rectangle: -1310,0 -1290,70
  rectangle: -1210,0 -1190,70
  rectangle: -1110,0 -1090,70
  rectangle: -1010,0 -990,70
  rectangle: -910,0 -890,70
  rectangle: -810,0 -790,70
  rectangle: -710,0 -690,70
  rectangle: -610,0 -590,70
  rectangle: -510,0 -490,70
  rectangle: -410,0 -390,70
  rectangle: -310,0 -290,70
  rectangle: -210,0 -190,70
  rectangle: -110,0 -90,70
  rectangle: -10,0 10,70
  rectangle: 90,0 110,70
  rectangle: 190,0 210,70
  rectangle: 290,0 310,70
  rectangle: 390,0 410,70
  rectangle: 490,0 510,70
  rectangle: 590,0 610,70
  rectangle: 690,0 710,70
  rectangle: 790,0 810,70
  rectangle: 890,0 910,70
  rectangle: 990,0 1010,70
  rectangle: 1090,0 1110,70
  rectangle: 1190,0 1210,70
  rectangle: 1290,0 1310,70
  rectangle: 1390,0 1410,70
  rectangle: 1490,0 1510,70
  rectangle: 1590,0 1610,70
  rectangle: 1690,0 1710,70